# Altium footprint library PCB_ConnectorHDR.PcbLib: 221 footprints (part 5 of 14)
Each footprint in its own frame and in the unit in brackets; x right, y up, seen from the top. Pads: shape width x height; smd on the part's side, far side on the other; paste and mask are expansions set on the pad; w line width, h text height; cw(c..) or ccw(c..) is an arc to the next point about the centre after c.
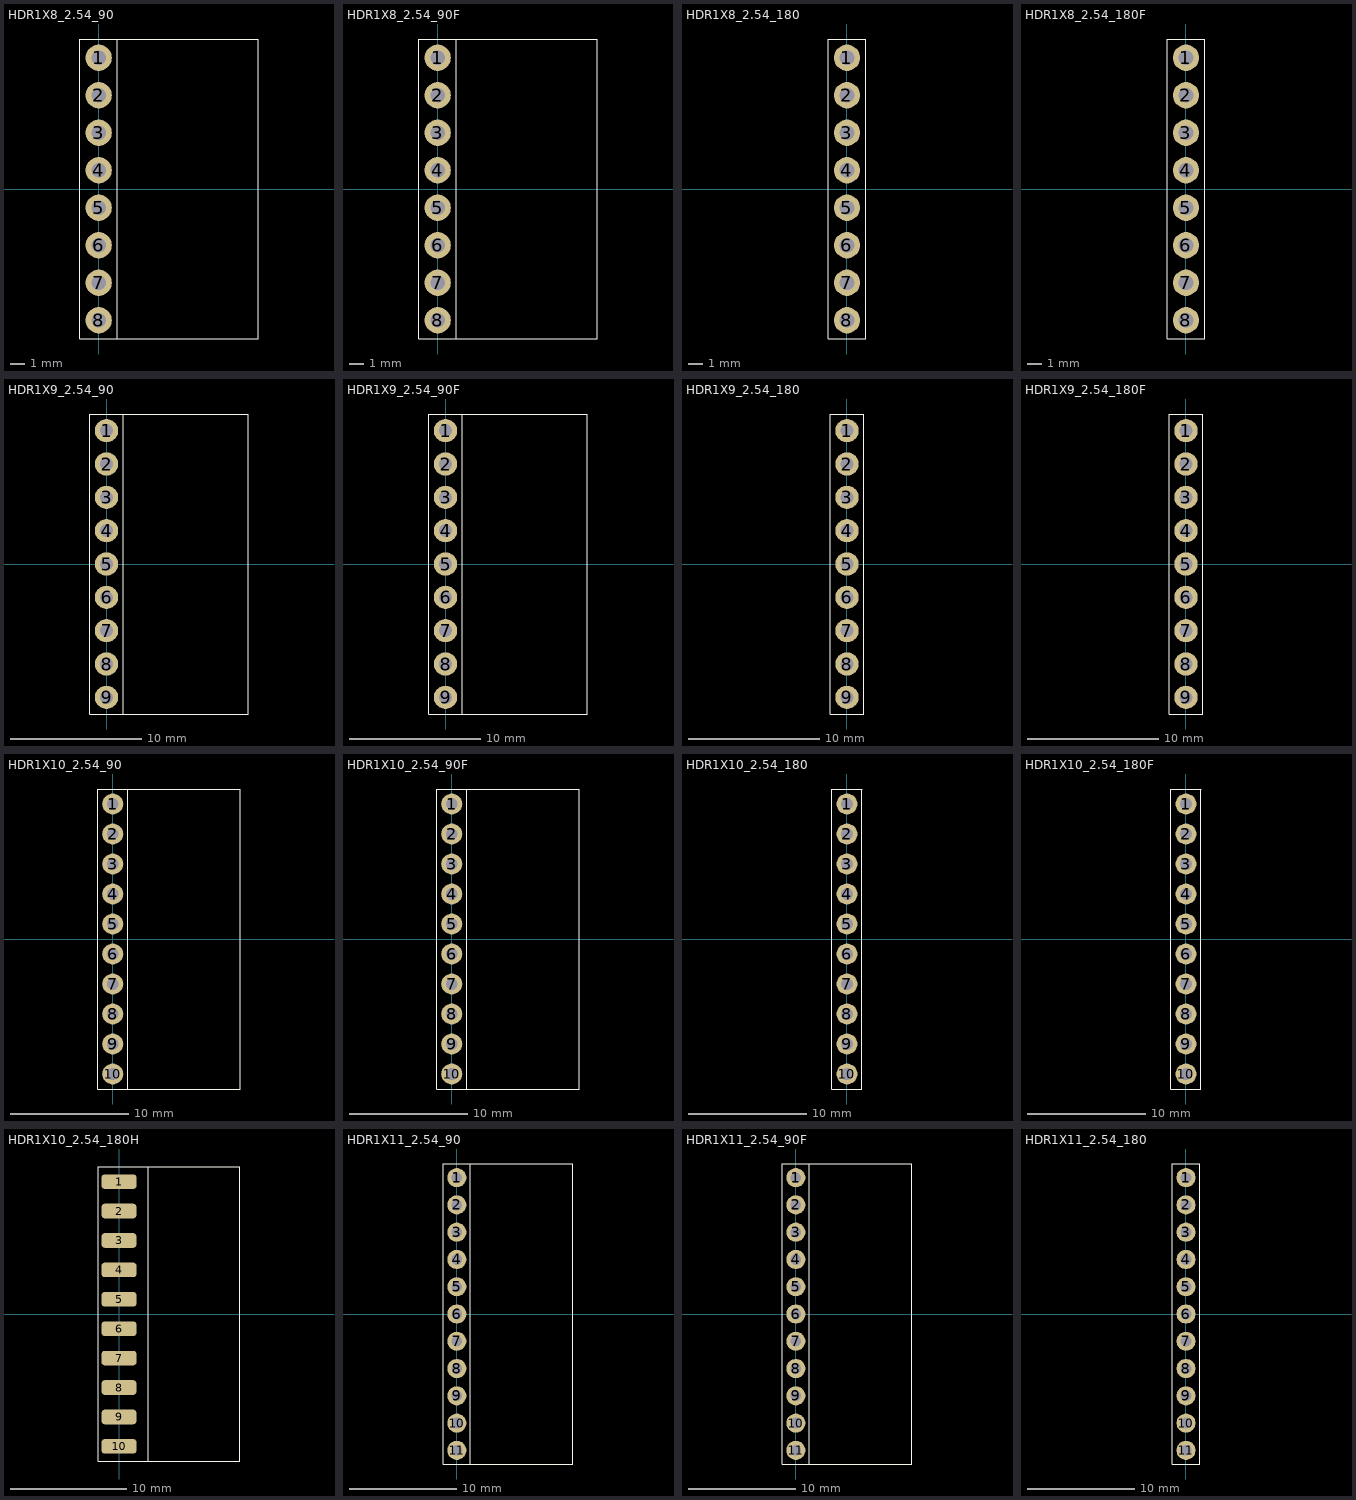
[diagram p4: the footprints below, top view; thin cyan lines are the x and y axes]

## HDR1X8_2.54_90 [mil]
height 169.29
pads (8):
  round 70 hole 39.37: 1(0,350) 2(0,250) 3(0,150) 4(0,50) 5(0,-50) 6(0,-150) 7(0,-250) 8(0,-350)
Top Overlay:
  lines w2: -50,-400 425,-400 425,400 -50,400 ; -50,-400 -50,400 ; -50,-400 50,-400 50,400 -50,400 ; -50,-400 -50,400
3D body "pin_header_aw140-ea-g08g.stp": height 98.93, standoff -93.99, extent -13,-396.13 425.58,396

## HDR1X8_2.54_90F [mil]
height 169.29
pads (8):
  round 70 hole 39.37: 1(0,350) 2(0,250) 3(0,150) 4(0,50) 5(0,-50) 6(0,-150) 7(0,-250) 8(0,-350)
Top Overlay:
  lines w2: -50,-400 -50,400 ; -50,-400 425,-400 425,400 -50,400 ; -50,-400 -50,400 ; -50,-400 50,-400 50,400 -50,400
3D body "female_header_a-bl254-ea-g08d.stp": height 98.93, standoff -125.48, extent -9,-404.84 387.06,405

## HDR1X8_2.54_180 [mil]
height 169.29
pads (8):
  round 70 hole 39.37: 1(0,350) 2(0,250) 3(0,150) 4(0,50) 5(0,-50) 6(0,-150) 7(0,-250) 8(0,-350)
Top Overlay:
  lines w2: -50,-400 50,-400 ; -50,-400 -50,400 ; -50,-400 -50,400 ; -50,-400 50,-400 ; -50,400 50,400 ; -50,400 50,400 ; 50,-400 50,400 ; 50,-400 50,400
3D body "pin_header_aw140-eg-g08d.stp": height 322.83, standoff -118.11, extent -49.18,-400 49.18,399.99

## HDR1X8_2.54_180F [mil]
height 169.29
pads (8):
  round 70 hole 39.37: 1(0,350) 2(0,250) 3(0,150) 4(0,50) 5(0,-50) 6(0,-150) 7(0,-250) 8(0,-350)
Top Overlay:
  lines w2: -50,-400 50,-400 ; -50,-400 -50,400 ; -50,-400 50,-400 ; -50,-400 -50,400 ; -50,400 50,400 ; -50,400 50,400 ; 50,-400 50,400 ; 50,-400 50,400
3D body "female_header_a-bl254-eg-g08d.stp": height 334.65, standoff -125.98, extent -49.21,-404.84 49.21,405

## HDR1X9_2.54_90 [mil]
height 169.29
pads (9):
  round 70 hole 39.37: 1(0,400) 2(0,300) 3(0,200) 4(0,100) 5(0,0) 6(0,-100) 7(0,-200) 8(0,-300) 9(0,-400)
Top Overlay:
  lines w2: -50,-450 -50,450 ; -50,-450 50,-450 50,450 -50,450 ; -50,-450 -50,450 ; -50,-450 425,-450 425,450 -50,450
3D body "pin_header_aw140-ea-g09g.stp": height 98.93, standoff -93.99, extent -13,-446.13 425.58,446

## HDR1X9_2.54_90F [mil]
height 169.29
pads (9):
  round 70 hole 39.37: 1(0,400) 2(0,300) 3(0,200) 4(0,100) 5(0,0) 6(0,-100) 7(0,-200) 8(0,-300) 9(0,-400)
Top Overlay:
  lines w2: -50,-450 -50,450 ; -50,-450 50,-450 50,450 -50,450 ; -50,-450 -50,450 ; -50,-450 425,-450 425,450 -50,450
3D body "female_header_a-bl254-ea-g09d.stp": height 98.93, standoff -125.48, extent -8.03,-455.84 388.03,454

## HDR1X9_2.54_180 [mil]
height 169.29
pads (9):
  round 70 hole 39.37: 1(0,400) 2(0,300) 3(0,200) 4(0,100) 5(0,0) 6(0,-100) 7(0,-200) 8(0,-300) 9(0,-400)
Top Overlay:
  lines w2: -50,-450 -50,450 ; -50,-450 50,-450 ; -50,-450 50,-450 ; -50,-450 -50,450 ; -50,450 50,450 ; -50,450 50,450 ; 50,-450 50,450 ; 50,-450 50,450
3D body "pin_header_aw140-eg-g09d.stp": height 322.83, standoff -118.11, extent -49.18,-449.99 49.18,450

## HDR1X9_2.54_180F [mil]
height 169.29
pads (9):
  round 70 hole 39.37: 1(0,400) 2(0,300) 3(0,200) 4(0,100) 5(0,0) 6(0,-100) 7(0,-200) 8(0,-300) 9(0,-400)
Top Overlay:
  lines w2: -50,-450 50,-450 ; -50,-450 -50,450 ; -50,-450 -50,450 ; -50,-450 50,-450 ; -50,450 50,450 ; -50,450 50,450 ; 50,-450 50,450 ; 50,-450 50,450
3D body "female_header_a-bl254-eg-g09d.stp": height 334.65, standoff -125.98, extent -48.21,-455 50.21,454.84

## HDR1X10_2.54_90 [mil]
height 169.29
pads (10):
  round 70 hole 39.37: 1(0,450) 2(0,350) 3(0,250) 4(0,150) 5(0,50) 6(0,-50) 7(0,-150) 8(0,-250) 9(0,-350) 10(0,-450)
Top Overlay:
  lines w2: -50,-500 -50,500 ; -50,-500 50,-500 50,500 -50,500 ; -50,-500 -50,500 ; -50,-500 425,-500 425,500 -50,500
3D body "pin_header_aw140-ea-g10g.stp": height 99.21, standoff -93.7, extent -15,-496.06 423.58,496.06

## HDR1X10_2.54_90F [mil]
height 169.29
pads (10):
  round 70 hole 39.37: 1(0,450) 2(0,350) 3(0,250) 4(0,150) 5(0,50) 6(0,-50) 7(0,-150) 8(0,-250) 9(0,-350) 10(0,-450)
Top Overlay:
  lines w2: -50,-500 425,-500 425,500 -50,500 ; -50,-500 -50,500 ; -50,-500 50,-500 50,500 -50,500 ; -50,-500 -50,500
3D body "female_header_a-bl254-ea-g10d.stp": height 98.93, standoff -125.48, extent -9,-505.84 387.06,504

## HDR1X10_2.54_180 [mil]
height 169.29
pads (10):
  round 70 hole 39.37: 1(0,450) 2(0,350) 3(0,250) 4(0,150) 5(0,50) 6(0,-50) 7(0,-150) 8(0,-250) 9(0,-350) 10(0,-450)
Top Overlay:
  lines w2: -50,-500 50,-500 ; -50,-500 -50,500 ; -50,-500 -50,500 ; -50,-500 50,-500 ; -50,500 50,500 ; -50,500 50,500 ; 50,-500 50,500 ; 50,-500 50,500
3D body "pin_header_aw140-eg-g10d.stp": height 322.83, standoff -118.11, extent -49.18,-500 49.18,500

## HDR1X10_2.54_180F [mil]
height 169.29
pads (10):
  round 70 hole 39.37: 1(0,450) 2(0,350) 3(0,250) 4(0,150) 5(0,50) 6(0,-50) 7(0,-150) 8(0,-250) 9(0,-350) 10(0,-450)
Top Overlay:
  lines w2: -50,-500 50,-500 ; -50,-500 -50,500 ; -50,-500 -50,500 ; -50,-500 50,-500 ; -50,500 50,500 ; -50,500 50,500 ; 50,-500 50,500 ; 50,-500 50,500
3D body "female_header_a-bl254-eg-g10d.stp": height 334.65, standoff -125.98, extent -49.2,-504.92 49.22,504.92

## HDR1X10_2.54_180H [mil]
height 169.29
pads (10):
  rrect50% 120x50 smd: 1(0,450) 2(0,350) 3(0,250) 4(0,150) 5(0,50) 6(0,-50) 7(0,-150) 8(0,-250) 9(0,-350) 10(0,-450)
Top Overlay:
  lines w2: -70,-500 100,-500 100,500 -70,500 ; -70,-500 -70,500 ; -70,-500 -70,500 ; -70,-500 410,-500 410,500 -70,500
3D body "pin_header_aw140-eg-g10d.stp": height 61.32, standoff -37.05, extent -35,-500 405.94,500

## HDR1X11_2.54_90 [mil]
height 169.29
pads (11):
  round 70 hole 39.37: 1(0,500) 2(0,400) 3(0,300) 4(0,200) 5(0,100) 6(0,0) 7(0,-100) 8(0,-200) 9(0,-300) 10(0,-400) 11(0,-500)
Top Overlay:
  lines w2: -50,-550 -50,550 ; -50,-550 425,-550 425,550 -50,550 ; -50,-550 -50,550 ; -50,-550 50,-550 50,550 -50,550
3D body "pin_header_aw140-ea-g11g.stp": height 98.93, standoff -93.99, extent -13,-546.13 425.58,546

## HDR1X11_2.54_90F [mil]
height 169.29
pads (11):
  round 70 hole 39.37: 1(0,500) 2(0,400) 3(0,300) 4(0,200) 5(0,100) 6(0,0) 7(0,-100) 8(0,-200) 9(0,-300) 10(0,-400) 11(0,-500)
Top Overlay:
  lines w2: -50,-550 -50,550 ; -50,-550 425,-550 425,550 -50,550 ; -50,-550 -50,550 ; -50,-550 50,-550 50,550 -50,550
3D body "female_header_a-bl254-ea-g11d.stp": height 98.93, standoff -125.48, extent -8,-554.84 388.06,555

## HDR1X11_2.54_180 [mil]
height 169.29
pads (11):
  round 70 hole 39.37: 1(0,500) 2(0,400) 3(0,300) 4(0,200) 5(0,100) 6(0,0) 7(0,-100) 8(0,-200) 9(0,-300) 10(0,-400) 11(0,-500)
Top Overlay:
  lines w2: -50,-550 -50,550 ; -50,-550 50,-550 ; -50,-550 -50,550 ; -50,-550 50,-550 ; -50,550 50,550 ; -50,550 50,550 ; 50,-550 50,550 ; 50,-550 50,550
3D body "pin_header_aw140-eg-g11d.stp": height 322.83, standoff -118.11, extent -49.18,-550 49.18,550